# Altium footprint library PcbLib1.PcbLib: 1009 footprints (part 18 of 64)
Each footprint in its own frame and in the unit in brackets; x right, y up, seen from the top. Pads: shape width x height; smd on the part's side, far side on the other; paste and mask are expansions set on the pad; w line width, h text height; cw(c..) or ccw(c..) is an arc to the next point about the centre after c.
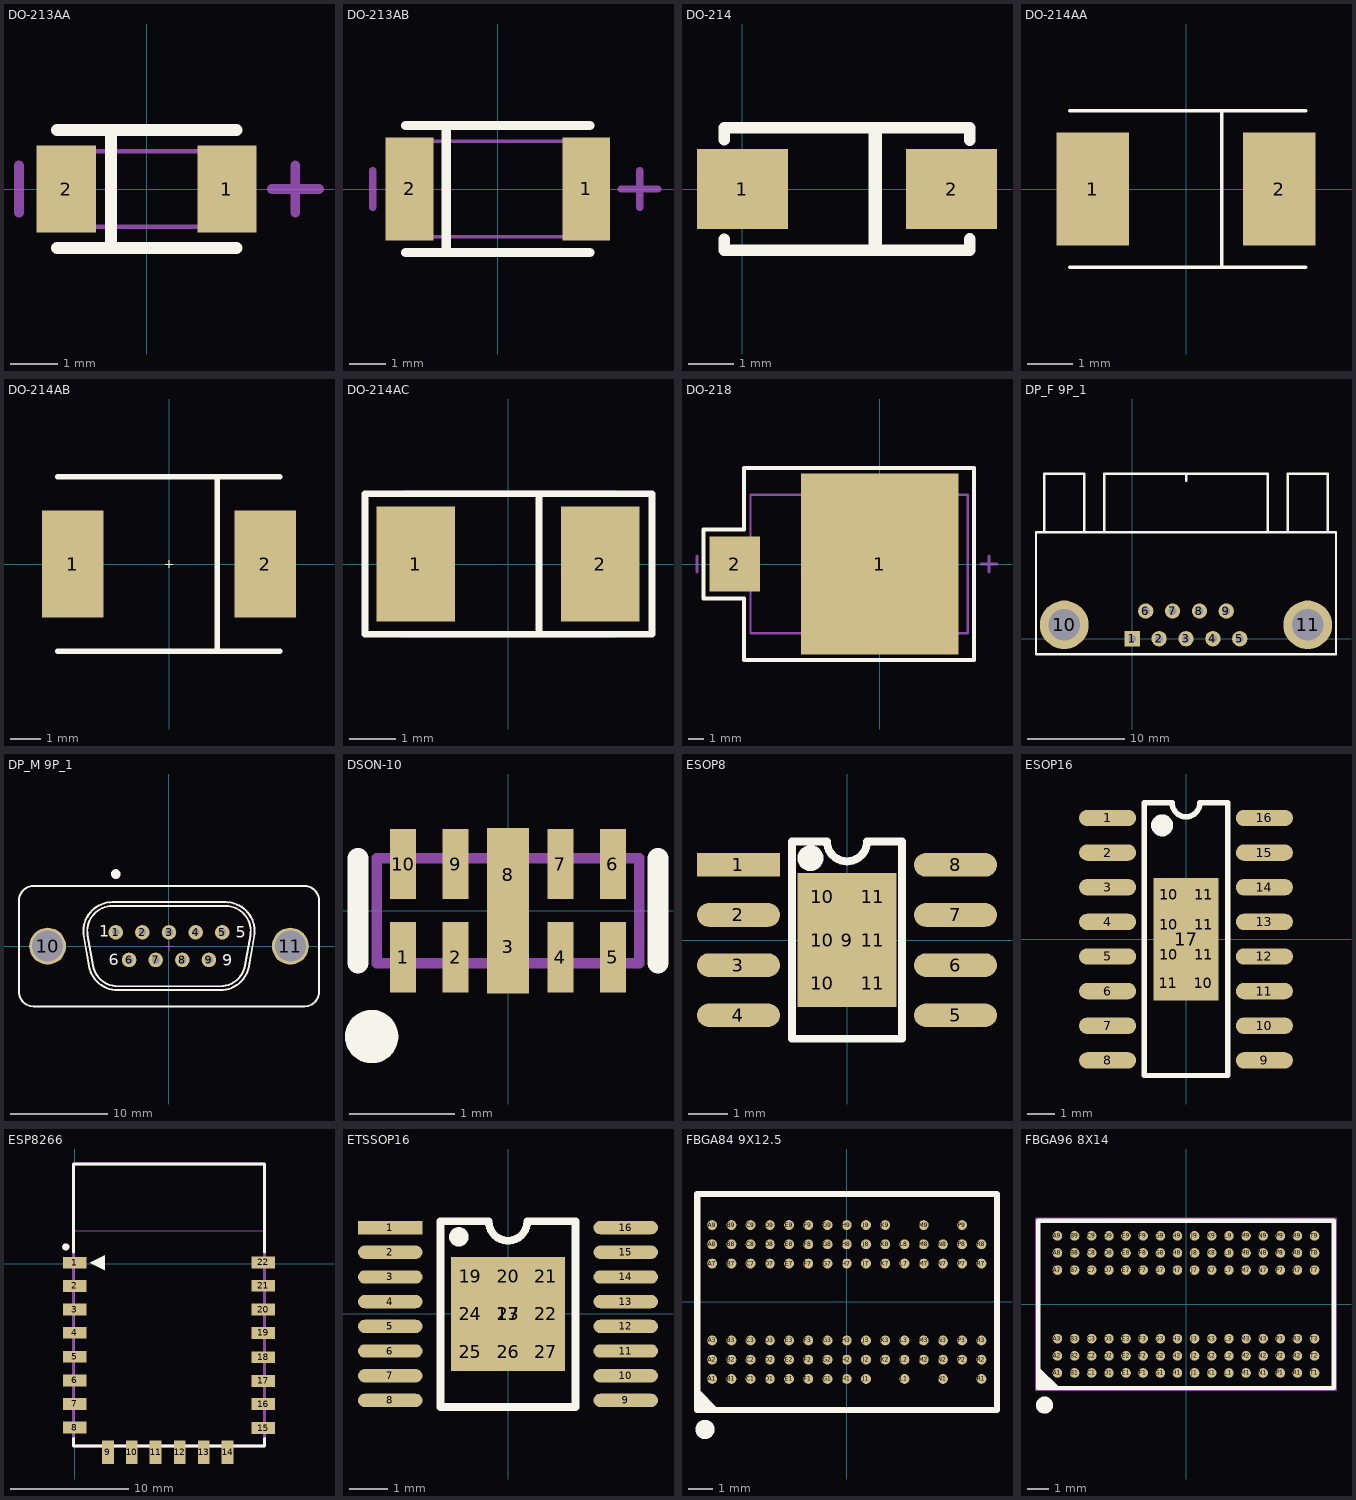
[diagram p17: the footprints below, top view; thin cyan lines are the x and y axes]

## DO-213AA [mm]
pads (2):
  rect 1.25x1.85 smd: 1(1.7,0) 2(-1.7,0)
Top Overlay:
  lines w0.254: -1.9,-1.25 1.9,-1.25 ; -1.9,1.25 1.9,1.25 ; -0.75,-1.25 -0.75,1.25
Mechanical 13:
  lines w0.1: -1.8,-0.8 1.8,-0.8 1.8,0.8 -1.8,0.8 -1.8,-0.8
Mechanical 15:
  lines w0.203: -2.7,-0.5 -2.7,0.5 ; 2.65,0 3.65,0 ; 3.15,-0.5 3.15,0.5

## DO-213AB [mm]
pads (2):
  rect 1.3x2.8 smd: 1(2.4,0) 2(-2.4,0)
Top Overlay:
  lines w0.254: -2.5,-1.725 2.5,-1.725 ; -2.5,1.725 2.5,1.725 ; -1.4,-1.725 -1.4,1.7
Mechanical 13:
  lines w0.1: -2.5,-1.3 2.5,-1.3 2.5,1.3 -2.5,1.3 -2.5,-1.3
Mechanical 15:
  lines w0.203: -3.4,-0.5 -3.4,0.5 ; 3.35,0 4.35,0 ; 3.85,-0.5 3.85,0.5

## DO-214 [mm]
height 2.7
pads (2):
  rect 2x1.75 smd: 1(0,0) 2(4.6,0)
Top Overlay:
  lines w0.254: -0.4,-1.105 -0.4,-1.35 5,-1.35 5,-1.1 ; -0.4,1.08 -0.4,1.35 4.995,1.35 ; 5,1.075 5,1.35
  lines w0.3: 2.92,-1.3 2.92,1.3
3D body "User Library-S1G.STEP": height 2.12, standoff -0.02, extent -0.198,-1.342 4.908,1.325

## DO-214AA [mm]
height 5.6
pads (2):
  rect 1.6x2.5 smd mask+0.051: 1(-2.06,0) 2(2.06,0)
Top Overlay:
  lines w0.076: -2.565,-1.727 2.642,-1.727 ; -2.565,1.727 2.642,1.727 ; 0.787,-1.727 0.787,1.727
3D body "p250-160.stp": height 0.02, standoff 0, extent 1.27,-1.25 2.87,1.25
3D body "p250-160.stp": height 0.02, standoff 0, extent -2.87,-1.25 -1.27,1.25
3D body "smb_do-214aa.stp": height 2, standoff 0, extent -2.489,-1.651 2.545,1.649

## DO-214AB [mm]
height 5.6
pads (2):
  rect 2x3.5 smd mask+0.051: 1(-3.14,0) 2(3.14,0)
Top Overlay:
  lines w0.005: -0.127,0 0.127,0 ; 0,-0.127 0,0.127
  lines w0.175: -3.632,-2.845 3.607,-2.845 ; -3.632,2.845 3.607,2.845 ; 1.577,-2.809 1.577,2.819
3D body "smc_do-214ab.stp": height 2, standoff 0, extent -3.558,-2.795 3.556,2.795
3D body "p350-250.stp": height 0.02, standoff 0, extent -4.175,-1.75 -2.175,1.75
3D body "p350-250.stp": height 0.02, standoff 0, extent 2.175,-1.75 4.175,1.75

## DO-214AC [mm]
height 5.6
pads (2):
  rect 1.7x2.5 smd: 1(-2,0) 2(2,0)
Top Overlay:
  lines w0.15: 0.675,-1.523 0.675,1.523 ; -3.099,-1.523 -3.099,1.523 3.124,1.523 3.124,-1.523 -3.099,-1.523
Mechanical 14:
  lines w0.15: -2.286,-1.523 2.286,-1.523 ; -2.235,1.523 2.311,1.523
Mechanical 15:
  lines w0.15: -2.286,-1.523 2.286,-1.523 ; -2.235,1.523 2.311,1.523
3D body "do214ac.stp": height 1.9, standoff 0.03, extent -2.485,-1.2 2.485,1.2
3D body "do214acpad.stp": height 0.01, standoff 0.01, extent 1.15,-1.25 2.85,1.25
3D body "do214acpad.stp": height 0.01, standoff 0.01, extent -2.85,-1.25 -1.15,1.25

## DO-218 [mm] "=DO-218AB"
pads (2):
  rect 10x11.5 smd: 1(0,0)
  rect 3.2x3.5 smd: 2(-9.2,0)
Top Overlay:
  lines w0.254: -11.2,-2.2 -8.6,-2.2 -8.6,-6.1 6,-6.1 6,6.1 -8.6,6.1 -8.6,2.2 -11.2,2.2 -11.2,-2.2
Mechanical 13:
  lines w0.152: -8.2,-4.4 5.6,-4.4 5.6,4.4 -8.2,4.4 -8.2,-4.4
Mechanical 15:
  lines w0.203: -11.6,-0.5 -11.6,0.5 ; 6.45,0 7.45,0 ; 6.95,-0.5 6.95,0.5
3D body "User Library-DO-218AB.STEP": height 5, standoff 0, extent -9.8,-5 5.629,5

## DP_F 9P_1 [mm]
pads (11):
  rect 1.575x1.575 hole 0.8: 1(0,0)
  round 1.575 hole 0.8: 2(2.76,0) 3(5.52,0) 4(8.28,0) 5(11.04,0) 6(1.38,2.84) 7(4.14,2.84) 8(6.9,2.84) 9(9.66,2.84)
  round 5 hole 3.25: 10(-6.98,1.42) 11(18.02,1.42)
Top Overlay:
  lines w0.254: -9.05,10.92 -9.05,16.92 -4.94,16.92 ; -4.91,10.92 -4.91,16.92 ; -2.85,10.92 -2.85,16.92 13.9,16.92 13.9,10.92 ; 5.525,16.2 5.525,16.9 ; 15.95,10.92 15.95,16.92 20.06,16.92 ; 20.09,10.92 20.09,16.92 ; -9.88,-1.58 20.92,-1.58 20.92,10.92 -9.88,10.92 -9.88,-1.58
3D body "SW3dPS-9-PIN_DSUB-1.STEP": height 12.81, standoff -2.91, extent -9.925,-2.012 20.885,17.063

## DP_M 9P_1 [mm] "Straight D-SUB 9 Male Contacts Connector with Harpoons and Female Screwlock (UNC4-40)"
height 11.7
pads (11):
  round 1.5 hole 0.8: 1(-5.486,1.423) 2(-2.743,1.423) 3(0,1.423) 4(2.743,1.423) 5(5.486,1.423) 6(-4.114,-1.423) 7(-1.371,-1.423) 8(1.372,-1.423) 9(4.115,-1.423)
  round 3.8 hole 3.2: 10(-12.495,0) 11(12.495,0)
Top Overlay:
  circle w0.5: c-5.48,7.42 r0.25
  lines w0.2: -15.445,-4.7 ccw(c-13.945,-4.7) -13.945,-6.2 13.945,-6.2 ccw(c13.945,-4.7) 15.445,-4.7 15.445,4.7 ccw(c13.945,4.7) 13.945,6.2 -13.945,6.2 ccw(c-13.945,4.7) -15.445,4.7 -15.445,-4.7 ; -8.775,1.021 cw(c-5.83,1.54) -5.83,4.53 5.83,4.53 cw(c5.83,1.54) 8.775,1.021 8.232,-2.059 cw(c5.287,-1.54) 5.287,-4.53 -5.287,-4.53 cw(c-5.287,-1.54) -8.231,-2.059 -8.775,1.021 ; -8.381,1.09 cw(c-5.83,1.54) -5.83,4.13 5.83,4.13 cw(c5.83,1.54) 8.381,1.09 7.838,-1.99 cw(c5.287,-1.54) 5.287,-4.13 -5.287,-4.13 cw(c-5.287,-1.54) -7.838,-1.99 -8.381,1.09
  text "6" at -6.21,-1.97 h1.2
  text "5" at 6.855,0.87 h1.2
  text "1" at -7.18,0.945 h1.2
  text "9" at 5.485,-2.02 h1.2
Mechanical 8:
  lines w0.1: -12.995,0 -12.495,0 ; -12.495,-0.5 -12.495,0 ; -12.495,0.5 -12.495,0 ; -11.995,0 -12.495,0 ; -5.986,1.423 -5.486,1.423 ; -5.486,0.923 -5.486,1.423 ; -5.486,1.923 -5.486,1.423 ; -4.986,1.423 -5.486,1.423 ; -4.614,-1.423 -4.114,-1.423 ; -4.114,-1.923 -4.114,-1.423 ; -4.114,-0.923 -4.114,-1.423 ; -3.614,-1.423 -4.114,-1.423 ; -3.243,1.423 -2.743,1.423 ; -2.743,0.923 -2.743,1.423 ; -2.743,1.923 -2.743,1.423 ; -2.243,1.423 -2.743,1.423 ; -1.871,-1.423 -1.371,-1.423 ; -1.371,-1.923 -1.371,-1.423 ; -1.371,-0.923 -1.371,-1.423 ; -0.871,-1.423 -1.371,-1.423 ; -0.5,0 0,0 ; -0.5,1.423 0,1.423 ; 0,-0.5 0,0 ; 0,0.5 0,0 ; 0,0.923 0,1.423 ; 0,1.923 0,1.423 ; 0.5,0 0,0 ; 0.5,1.423 0,1.423 ; 0.872,-1.423 1.372,-1.423 ; 1.372,-1.923 1.372,-1.423 ; 1.372,-0.923 1.372,-1.423 ; 1.872,-1.423 1.372,-1.423 ; 2.243,1.423 2.743,1.423 ; 2.743,0.923 2.743,1.423 ; 2.743,1.923 2.743,1.423 ; 3.243,1.423 2.743,1.423 ; 3.615,-1.423 4.115,-1.423 ; 4.115,-1.923 4.115,-1.423 ; 4.115,-0.923 4.115,-1.423 ; 4.615,-1.423 4.115,-1.423 ; 4.986,1.423 5.486,1.423 ; 5.486,0.923 5.486,1.423 ; 5.486,1.923 5.486,1.423 ; 5.986,1.423 5.486,1.423 ; 11.995,0 12.495,0 ; 12.495,-0.5 12.495,0 ; 12.495,0.5 12.495,0 ; 12.995,0 12.495,0
Mechanical 14:
  circle w0.1: c-4.114,-1.423 r0.51
  circle w0.1: c-1.371,-1.423 r0.51
  circle w0.1: c1.372,-1.423 r0.51
  circle w0.1: c4.115,-1.423 r0.51
  circle w0.1: c5.486,1.423 r0.51
  circle w0.1: c2.743,1.423 r0.51
  circle w0.1: c0,1.423 r0.51
  circle w0.1: c-2.743,1.423 r0.51
  circle w0.1: c-5.486,1.423 r0.51
  circle w0.1: c12.495,0 r1.422
  circle w0.1: c-12.495,0 r1.422
  lines w0.1: -15.445,-4.7 ccw(c-13.945,-4.7) -13.945,-6.2 13.945,-6.2 ccw(c13.945,-4.7) 15.445,-4.7 15.445,4.7 ccw(c13.945,4.7) 13.945,6.2 -13.945,6.2 ccw(c-13.945,4.7) -15.445,4.7 -15.445,-4.7 ; -8.775,1.021 cw(c-5.83,1.54) -5.83,4.53 5.83,4.53 cw(c5.83,1.54) 8.775,1.021 8.232,-2.059 cw(c5.287,-1.54) 5.287,-4.53 -5.287,-4.53 cw(c-5.287,-1.54) -8.231,-2.059 -8.775,1.021 ; -8.381,1.09 cw(c-5.83,1.54) -5.83,4.13 5.83,4.13 cw(c5.83,1.54) 8.381,1.09 7.838,-1.99 cw(c5.287,-1.54) 5.287,-4.13 -5.287,-4.13 cw(c-5.287,-1.54) -7.838,-1.99 -8.381,1.09
  text "9" at 5.485,-2.02 h1.2
  text "1" at -7.18,0.945 h1.2
  text "5" at 6.855,0.87 h1.2
  text "6" at -6.21,-1.97 h1.2
  text "9 D-Sub Male" at -6.053,4.872 h1.2
3D body "TYCO_1-338309-2.stp": height 11.95, standoff -3.2, extent -15.445,-6.2 15.445,6.2

## DSON-10 [mm]
pads (10):
  rect 0.25x0.67 smd mask+0.051: 1(-1,-0.445) 2(-0.5,-0.445) 4(0.5,-0.445) 5(1,-0.445) 6(1,0.445) 7(0.5,0.445) 9(-0.5,0.445) 10(-1,0.445)
  rect 0.4x0.889 smd mask+0.051: 3(0,-0.343) 8(0,0.343)
Top Overlay:
  circle w0.254: c-1.3,-1.2 r0.127
  lines w0.2: -1.43,-0.5 -1.43,0.5 ; 1.43,-0.5 1.43,0.5
Mechanical 13:
  lines w0.1: -1.25,-0.5 1.25,-0.5 1.25,0.5 -1.25,0.5 -1.25,-0.5

## ESOP8 [mm]
pads (15):
  rect 2.1x0.6 smd: 1(-2.75,1.905)
  oval 2.1x0.6 smd: 2(-2.75,0.635) 3(-2.75,-0.635) 4(-2.75,-1.905) 5(2.75,-1.905) 6(2.75,-0.635) 7(2.75,0.635) 8(2.75,1.905)
  rect 2.5x3.4 smd paste-2: 9(0,0)
  rect 0.9x0.7 on Top Paste: 10(-0.625,-1.1) 10(-0.625,0) 10(-0.625,1.1) 11(0.65,-1.1) 11(0.65,0) 11(0.65,1.1)
Top Overlay:
  circle w0.35: c-0.925,2.075 r0.155
  lines w0.2: -1.397,2.5 -1.397,-2.5 1.397,-2.5 1.397,2.5
  lines w0.203: -1.397,2.5 -0.508,2.5 ccw(c0,2.5) 0,1.992 ccw(c0,2.5) 0.508,2.5 1.397,2.5
Mechanical 15:
  circle w0.05: c0,0 r0.35
  lines w0.05: -0.5,0 0.5,0 ; 0,-0.5 0,0.5
3D body "ESOP8.STEP": height 1.53, standoff -0.01, extent -3.053,-2.5 2.953,2.5

## ESOP16 [mm]
pads (25):
  oval 2.1x0.6 smd: 1(-2.875,4.445) 2(-2.875,3.175) 3(-2.875,1.905) 4(-2.875,0.635) 5(-2.875,-0.635) 6(-2.875,-1.905) 7(-2.875,-3.175) 8(-2.875,-4.445) 9(2.875,-4.445) 10(2.875,-3.175) 11(2.875,-1.905) 12(2.875,-0.635) 13(2.875,0.635) 14(2.875,1.905) 15(2.875,3.175) 16(2.875,4.445)
  rect 0.9x0.7 on Top Paste: 10(-0.625,-0.575) 10(-0.625,0.525) 10(-0.625,1.625) 10(0.625,-1.625) 11(-0.65,-1.625) 11(0.65,-0.575) 11(0.65,0.525) 11(0.65,1.625)
  rect 2.4x4.5 smd paste-3: 17(0,0)
Top Overlay:
  circle w0.5: c-0.875,4.175 r0.155
  lines w0.2: -1.524,5 -1.524,-5 1.524,-5 1.524,5
  lines w0.203: -1.524,5 -0.508,5 ccw(c0,5) 0,4.492 ccw(c0,5) 0.508,5 1.524,5
Mechanical 15:
  circle w0.05: c0,0 r0.35
  lines w0.05: -0.5,0 0.5,0 ; 0,-0.5 0,0.5
3D body "ESOP16.STEP": height 1.53, standoff -0.03, extent -2.928,-5.025 3.078,4.975

## ESP8266 [mm]
height 10
pads (22):
  rect 2x1 smd: 1(0,0.074) 2(0,-1.896) 3(0,-3.896) 4(0,-5.866) 5(0,-7.906) 6(0,-9.916) 7(0,-11.906) 8(0,-13.916) 15(16,-13.956) 16(16,-11.916) 17(16,-9.956) 18(16,-7.936) 19(16,-5.876) 20(16,-3.896) 21(16,-1.876) 22(16,0.104)
  rect 1x2 smd: 9(2.814,-16.002) 10(4.846,-16.002) 11(6.858,-16.002) 12(8.91,-16.002) 13(10.942,-16.002) 14(12.974,-16.002)
Top Overlay:
  circle w0.3: c-0.762,1.43 r0.15
  region: 1.27,0.074 2.54,-0.561 2.54,0.709
  lines w0.254: -0.084,-14.842 -0.084,-15.494 16.084,-15.494 16.084,-14.842 ; -0.084,0.991 -0.084,8.445 16.084,8.445 16.084,0.991
Mechanical 13:
  lines w0.051: -0.127,2.802 16.129,2.802 16.129,8.456 -0.127,8.456 -0.127,2.802
  lines w0.254: -0.084,-15.494 -0.084,8.446 16.084,8.446 16.084,-15.494 -0.084,-15.494
3D body "EPS8266 ESP-12E.STEP": height 2.65, standoff -0.04, extent -0.004,-15.487 16.006,8.518

## ETSSOP16 [mm]
pads (26):
  rect 1.7x0.35 smd: 1(-3.1,2.275)
  oval 1.7x0.35 smd: 2(-3.1,1.625) 3(-3.1,0.975) 4(-3.1,0.325) 5(-3.1,-0.325) 6(-3.1,-0.975) 7(-3.1,-1.625) 8(-3.1,-2.275) 9(3.1,-2.275) 10(3.1,-1.625) 11(3.1,-0.975) 12(3.1,-0.325) 13(3.1,0.325) 14(3.1,0.975) 15(3.1,1.625) 16(3.1,2.275)
  rect 3x3 smd paste-3: 17(0,0)
  rect 0.75x0.75 on Top Paste: 19(-1,1) 20(0,1) 21(1,1) 22(1,0) 23(0,0) 24(-1,0) 25(-1,-1) 26(0,-1) 27(1,-1)
Top Overlay:
  circle w0.254: c-1.295,2.032 r0.13
  lines w0.2: -1.778,-2.45 -1.778,2.44 -0.508,2.44 ccw(c0,2.44) 0.508,2.44 1.778,2.44 1.778,-2.45 -1.778,-2.45
Mechanical 15:
  circle w0.05: c0,0 r0.35
  lines w0.05: -0.5,0 0.5,0 ; 0,-0.5 0,0.5
3D body "ETSSOP16.STEP": height 1.03, standoff -0.02, extent -3.253,-2.511 3.151,2.489

## FBGA84 9X12.5 [mm]
pads (84):
  round 0.41 smd mask+0.051: A1(-5.6,-3.2) A2(-5.6,-2.4) A3(-5.6,-1.6) A7(-5.6,1.6) A8(-5.6,2.4) A9(-5.6,3.2) B1(-4.8,-3.2) B2(-4.8,-2.4) B3(-4.8,-1.6) B7(-4.8,1.6) B8(-4.8,2.4) B9(-4.8,3.2) C1(-4,-3.2) C2(-4,-2.4) C3(-4,-1.6) C7(-4,1.6) C8(-4,2.4) C9(-4,3.2) D1(-3.2,-3.2) D2(-3.2,-2.4) D3(-3.2,-1.6) D7(-3.2,1.6) D8(-3.2,2.4) D9(-3.2,3.2) E1(-2.4,-3.2) E2(-2.4,-2.4) E3(-2.4,-1.6) E7(-2.4,1.6) E8(-2.4,2.4) E9(-2.4,3.2) F1(-1.6,-3.2) F2(-1.6,-2.4) F3(-1.6,-1.6) F7(-1.6,1.6) F8(-1.6,2.4) F9(-1.6,3.2) G1(-0.8,-3.2) G2(-0.8,-2.4) G3(-0.8,-1.6) G7(-0.8,1.6) G8(-0.8,2.4) G9(-0.8,3.2) H1(0,-3.2) H2(0,-2.4) H3(0,-1.6) H7(0,1.6) H8(0,2.4) H9(0,3.2) J1(0.8,-3.2) J2(0.8,-2.4) J3(0.8,-1.6) J7(0.8,1.6) J8(0.8,2.4) J9(0.8,3.2) K2(1.6,-2.4) K3(1.6,-1.6) K7(1.6,1.6) K8(1.6,2.4) K9(1.6,3.2) L1(2.4,-3.2) L2(2.4,-2.4) L3(2.4,-1.6) L7(2.4,1.6) L8(2.4,2.4) M2(3.2,-2.4) M3(3.2,-1.6) M7(3.2,1.6) M8(3.2,2.4) M9(3.2,3.2) N1(4,-3.2) N2(4,-2.4) N3(4,-1.6) N7(4,1.6) N8(4,2.4) P2(4.8,-2.4) P3(4.8,-1.6) P7(4.8,1.6) P8(4.8,2.4) P9(4.8,3.2) R1(5.6,-3.2) R2(5.6,-2.4) R3(5.6,-1.6) R7(5.6,1.6) R8(5.6,2.4)
Top Overlay:
  circle w0.4: c-5.9,-5.3 r0.2
  region: -6.231,-4.5 -5.3,-4.5 -6.227,-3.573 -6.231,-3.573
  lines w0.254: -6.223,-4.5 -6.223,4.5 6.25,4.5 6.25,-4.5 -6.223,-4.5

## FBGA96 8X14 [mm]
pads (96):
  round 0.45 smd mask+0.051: A1(-6,-3.2) A2(-6,-2.4) A3(-6,-1.6) A7(-6,1.6) A8(-6,2.4) A9(-6,3.2) B1(-5.2,-3.2) B2(-5.2,-2.4) B3(-5.2,-1.6) B7(-5.2,1.6) B8(-5.2,2.4) B9(-5.2,3.2) C1(-4.4,-3.2) C2(-4.4,-2.4) C3(-4.4,-1.6) C7(-4.4,1.6) C8(-4.4,2.4) C9(-4.4,3.2) D1(-3.6,-3.2) D2(-3.6,-2.4) D3(-3.6,-1.6) D7(-3.6,1.6) D8(-3.6,2.4) D9(-3.6,3.2) E1(-2.8,-3.2) E2(-2.8,-2.4) E3(-2.8,-1.6) E7(-2.8,1.6) E8(-2.8,2.4) E9(-2.8,3.2) F1(-2,-3.2) F2(-2,-2.4) F3(-2,-1.6) F7(-2,1.6) F8(-2,2.4) F9(-2,3.2) G1(-1.2,-3.2) G2(-1.2,-2.4) G3(-1.2,-1.6) G7(-1.2,1.6) G8(-1.2,2.4) G9(-1.2,3.2) H1(-0.4,-3.2) H2(-0.4,-2.4) H3(-0.4,-1.6) H7(-0.4,1.6) H8(-0.4,2.4) H9(-0.4,3.2) J1(0.4,-3.2) J2(0.4,-2.4) J3(0.4,-1.6) J7(0.4,1.6) J8(0.4,2.4) J9(0.4,3.2) K1(1.2,-3.2) K2(1.2,-2.4) K3(1.2,-1.6) K7(1.2,1.6) K8(1.2,2.4) K9(1.2,3.2) L1(2,-3.2) L2(2,-2.4) L3(2,-1.6) L7(2,1.6) L8(2,2.4) L9(2,3.2) M1(2.8,-3.2) M2(2.8,-2.4) M3(2.8,-1.6) M7(2.8,1.6) M8(2.8,2.4) M9(2.8,3.2) N1(3.6,-3.2) N2(3.6,-2.4) N3(3.6,-1.6) N7(3.6,1.6) N8(3.6,2.4) N9(3.6,3.2) P1(4.4,-3.2) P2(4.4,-2.4) P3(4.4,-1.6) P7(4.4,1.6) P8(4.4,2.4) P9(4.4,3.2) R1(5.2,-3.2) R2(5.2,-2.4) R3(5.2,-1.6) R7(5.2,1.6) R8(5.2,2.4) R9(5.2,3.2) T1(6,-3.2) T2(6,-2.4) T3(6,-1.6) T7(6,1.6) T8(6,2.4) T9(6,3.2)
Top Overlay:
  circle w0.4: c-6.6,-4.7 r0.2
  region: -6.9,-2.9 -5.9,-3.9 -6.9,-3.9
  lines w0.2: -6.9,-3.9 6.9,-3.9 6.9,3.9 -6.9,3.9 -6.9,-3.9
Mechanical 13:
  lines w0.1: -7,-4 -7,4 7,4 7,-4 -7,-4
3D body "VFBGA96.STEP": height 1, standoff 0, extent -6.5,-4 6.5,4